# Altium footprint library Pcb-hionyPcbLib.PcbLib: 580 footprints (part 7 of 37)
Each footprint in its own frame and in the unit in brackets; x right, y up, seen from the top. Pads: shape width x height; smd on the part's side, far side on the other; paste and mask are expansions set on the pad; w line width, h text height; cw(c..) or ccw(c..) is an arc to the next point about the centre after c.
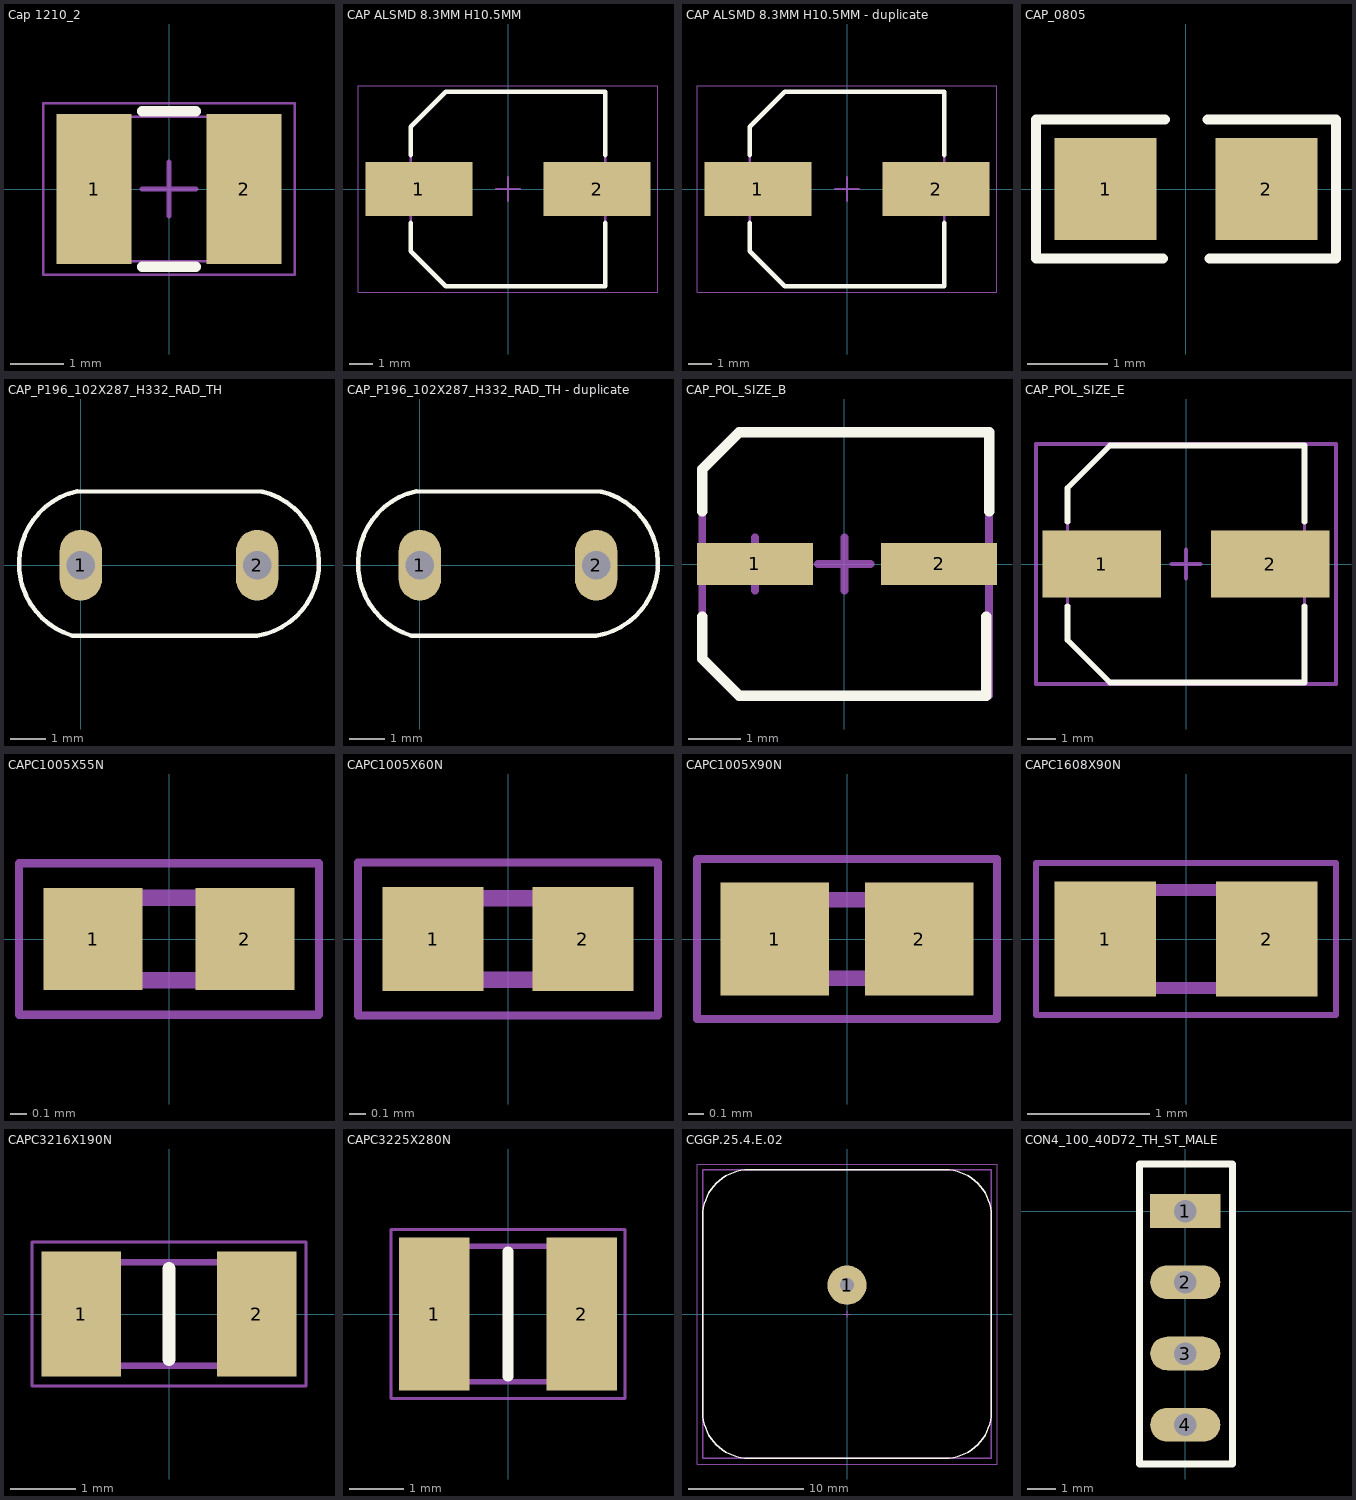
[diagram p6: the footprints below, top view; thin cyan lines are the x and y axes]

## Cap 1210_2 [mm]
pads (2):
  rect 1.4x2.8 smd: 1(-1.4,0) 2(1.4,0)
Top Overlay:
  lines w0.2: -0.5,-1.45 0.5,-1.45 ; -0.5,1.45 0.5,1.45
Mechanical 11:
  text ".Designator" at -0.675,-0.225 h0.5
Mechanical 13:
  lines w0.05: -1.7,-1.35 1.7,-1.35 1.7,1.35 -1.7,1.35 -1.7,-1.35
Mechanical 15:
  lines w0.05: -2.35,-1.6 2.35,-1.6 2.35,1.6 -2.35,1.6 -2.35,-1.6
  lines w0.1: -0.5,0 0.5,0 ; 0,-0.5 0,0.5
3D body: height 2.8, standoff 0, extent -1.2,-1.35 1.2,1.35
3D body: height 2.8, standoff 0, extent -1.7,-1.35 -1.2,1.35
3D body: height 2.8, standoff 0, extent 1.2,-1.35 1.7,1.35

## CAP ALSMD 8.3MM H10.5MM [mm]
pads (2):
  rect 4.55x2.3 smd: 1(-3.8,0) 2(3.8,0)
Top Overlay:
  lines w0.2: -4.15,-1.45 -4.15,-2.65 -2.65,-4.15 4.15,-4.15 4.15,-1.45 ; -4.15,1.45 -4.15,2.65 -2.65,4.15 4.15,4.15 4.15,1.45
Mechanical 13:
  lines w0.1: -4.15,-2.65 -2.65,-4.15 4.15,-4.15 4.15,4.15 -2.65,4.15 -4.15,2.65 -4.15,-2.65
Mechanical 15:
  lines w0.05: -6.4,-4.4 -6.4,4.4 6.4,4.4 6.4,-4.4 -6.4,-4.4
  lines w0.1: -0.5,0 0.5,0 ; 0,-0.5 0,0.5
3D body "CAP ALUM 8_3mm.STEP": height 10.5, standoff 0, extent -4.95,-4.15 4.95,4.15

## CAP ALSMD 8.3MM H10.5MM - duplicate [mm]
pads (2):
  rect 4.55x2.3 smd: 1(-3.8,0) 2(3.8,0)
Top Overlay:
  lines w0.2: -4.15,-1.45 -4.15,-2.65 -2.65,-4.15 4.15,-4.15 4.15,-1.45 ; -4.15,1.45 -4.15,2.65 -2.65,4.15 4.15,4.15 4.15,1.45
Mechanical 13:
  lines w0.1: -4.15,-2.65 -2.65,-4.15 4.15,-4.15 4.15,4.15 -2.65,4.15 -4.15,2.65 -4.15,-2.65
Mechanical 15:
  lines w0.05: -6.4,-4.4 -6.4,4.4 6.4,4.4 6.4,-4.4 -6.4,-4.4
  lines w0.1: -0.5,0 0.5,0 ; 0,-0.5 0,0.5
3D body "CAP ALUM 8_3mm.STEP": height 10.5, standoff 0, extent -4.95,-4.15 4.95,4.15

## CAP_0805 [mm] "Ceramic Capacitor"
height 0.7
pads (2):
  rect 1.27x1.27 smd mask+0.076: 1(-1,0) 2(1,0)
Top Overlay:
  lines w0.127: -0.289,-0.864 -1.864,-0.864 -1.864,0.864 -0.263,0.864 ; 0.27,0.864 1.845,0.864 ; 0.295,-0.864 1.845,-0.864 ; 1.864,-0.864 1.864,0.864
3D body "0805 SMD Capacitor.STEP": height 0.78, standoff 0, extent -1,-0.625 1,0.625

## CAP_P196_102X287_H332_RAD_TH [mm]
pads (2):
  oval 1.2x2 hole 0.8 mask+0.076: 1(0,0) 2(5,0)
Top Overlay:
  lines w0.127: -0.243,-1.993 cw(c0.368,0.034) -0.1,2.1 5.131,2.083 ; -0.2,-2 5,-2 ccw(c4.667,0.057) 5.156,2.083
3D body "User Library-CAPML200 (2_5x6_6).step": height 9.14, standoff -3.77, extent -1.037,-1.3 6.037,1.3

## CAP_P196_102X287_H332_RAD_TH - duplicate [mm]
pads (2):
  oval 1.2x2 hole 0.8 mask+0.076: 1(0,0) 2(5,0)
Top Overlay:
  lines w0.127: -0.243,-1.993 cw(c0.368,0.034) -0.1,2.1 5.131,2.083 ; -0.2,-2 5,-2 ccw(c4.667,0.057) 5.156,2.083
3D body "User Library-CAPML200 (2_5x6_6).step": height 9.14, standoff -3.77, extent -1.037,-1.3 6.037,1.3

## CAP_POL_SIZE_B [mm]
pads (2):
  rect 2.2x0.8 smd: 1(-1.7,0) 2(1.8,0)
Top Overlay:
  lines w0.2: -2.7,-1 -2.7,-1.8 -2,-2.5 2.7,-2.5 2.7,-1 ; -2.7,1 -2.7,1.8 -2,2.5 2.75,2.5 2.75,1
Mechanical 15:
  lines w0.15: -2.2,0 -1.2,0 ; -1.7,-0.5 -1.7,0.5 ; -0.5,0 0.5,0 ; 0,-0.5 0,0.5 ; -2.7,-1.8 -2.7,1.8 -2,2.5 2.75,2.5 2.75,-2.5 -2,-2.5 -2.7,-1.8
  text ".Designator" at -0.741,0.85 h0.55
3D body "猞4 SIZE CODE B.stp": height 5.8, standoff 0, extent -2.5,-2.15 2.5,2.15

## CAP_POL_SIZE_E [mm]
pads (2):
  rect 4.15x2.35 smd: 1(-2.95,0) 2(2.95,0)
Top Overlay:
  lines w0.2: -4.15,-1.475 -4.15,-2.663 -2.663,-4.15 4.15,-4.15 4.15,-1.475 ; -4.15,1.475 -4.15,2.663 -2.663,4.15 4.15,4.15 4.15,1.475
Mechanical 13:
  lines w0.1: -4.15,-2.663 -2.663,-4.15 4.15,-4.15 4.15,4.15 -2.663,4.15 -4.15,2.663 -4.15,-2.663
Mechanical 15:
  lines w0.1: -4.9,0 -3.4,0 ; -4.15,-0.75 -4.15,0.75
  lines w0.15: -0.5,0 0.5,0 ; 0,-0.5 0,0.5 ; -5.25,-4.2 -5.25,4.2 5.25,4.2 5.25,-4.2 -5.25,-4.2
  text ".Designator" at 1.825,-0.98 h0.55
3D body "User Library-capacitor size E.step": height 6.2, standoff -0.01, extent -4.5,-4.15 4.5,4.15

## CAPC1005X55N [mm]
pads (2):
  rect 0.6x0.62 smd: 1(-0.46,0) 2(0.46,0)
Mechanical 13:
  lines w0.1: -0.5,-0.25 0.5,-0.25 0.5,0.25 -0.5,0.25 -0.5,-0.25
Mechanical 15:
  lines w0.05: -0.91,-0.46 0.91,-0.46 0.91,0.46 -0.91,0.46 -0.91,-0.46
3D body "CL05B104KO5NNNC.stp": height 0.55, standoff 0, extent -0.5,-0.25 0.5,0.25

## CAPC1005X60N [mm]
pads (2):
  rect 0.62x0.64 smd: 1(-0.46,0) 2(0.46,0)
Mechanical 13:
  lines w0.1: -0.5,-0.25 0.5,-0.25 0.5,0.25 -0.5,0.25 -0.5,-0.25
Mechanical 15:
  lines w0.05: -0.92,-0.47 0.92,-0.47 0.92,0.47 -0.92,0.47 -0.92,-0.47
3D body "CL05A105KA5NQNC.stp": height 0.6, standoff 0, extent -0.5,-0.25 0.5,0.25

## CAPC1005X90N [mm]
pads (2):
  rect 0.69x0.72 smd: 1(-0.46,0) 2(0.46,0)
Mechanical 13:
  lines w0.1: -0.5,-0.25 -0.5,0.25 0.5,0.25 0.5,-0.25 -0.5,-0.25
Mechanical 15:
  lines w0.05: -0.955,-0.51 -0.955,0.51 0.955,0.51 0.955,-0.51 -0.955,-0.51
3D body "CL05A475MP5NRNC.stp": height 0.9, standoff 0, extent -0.5,-0.25 0.5,0.25

## CAPC1608X90N [mm]
pads (2):
  rect 0.83x0.94 smd: 1(-0.66,0) 2(0.66,0)
Mechanical 13:
  lines w0.1: -0.8,-0.4 0.8,-0.4 0.8,0.4 -0.8,0.4 -0.8,-0.4
Mechanical 15:
  lines w0.05: -1.225,-0.62 1.225,-0.62 1.225,0.62 -1.225,0.62 -1.225,-0.62
3D body "CC0603KRX7R9BB104.stp": height 0.9, standoff 0, extent -0.8,-0.4 0.8,0.4

## CAPC3216X190N [mm]
pads (2):
  rect 1.22x1.92 smd: 1(-1.35,0) 2(1.35,0)
Top Overlay:
  lines w0.2: 0,-0.7 0,0.7
Mechanical 13:
  lines w0.1: -1.6,-0.8 -1.6,0.8 1.6,0.8 1.6,-0.8 -1.6,-0.8
Mechanical 15:
  lines w0.05: -2.11,-1.11 -2.11,1.11 2.11,1.11 2.11,-1.11 -2.11,-1.11
3D body "1206B475K500NT.stp": height 1.9, standoff 0, extent -1.6,-0.8 1.6,0.8

## CAPC3225X280N [mm]
pads (2):
  rect 1.3x2.82 smd: 1(-1.36,0) 2(1.36,0)
Top Overlay:
  lines w0.2: 0,-1.15 0,1.15
Mechanical 13:
  lines w0.1: -1.6,-1.25 -1.6,1.25 1.6,1.25 1.6,-1.25 -1.6,-1.25
Mechanical 15:
  lines w0.05: -2.16,-1.56 -2.16,1.56 2.16,1.56 2.16,-1.56 -2.16,-1.56
3D body "CL32A107MPVNNNE.stp": height 2.8, standoff 0, extent -1.6,-1.25 1.6,1.25

## CGGP.25.4.E.02 [mm]
pads (1):
  round 3.4 hole 1.2: 1(0,2.5)
Top Overlay:
  lines w0.127: -12.5,-8.5 ccw(c-8.5,-8.5) -8.5,-12.5 8.5,-12.5 ccw(c8.5,-8.5) 12.5,-8.5 12.5,8.5 ccw(c8.5,8.5) 8.5,12.5 -8.5,12.5 ccw(c-8.5,8.5) -12.5,8.5 -12.5,-8.5
Mechanical 11:
  text ".Designator" at -0.573,4.994 h0.5
Mechanical 13:
  lines w0.127: -12.5,-12.5 12.5,-12.5 12.5,12.5 -12.5,12.5 -12.5,-12.5
Mechanical 15:
  lines w0.05: -0.3,0 0.3,0 ; 0,-0.3 0,0.3
  lines w0.064: -13,-13 13,-13 13,13 -13,13 -13,-13
3D body "CGGP.25.4.E.02.step": height 4.73, standoff -1.47, extent -12.55,-12.55 12.55,12.55

## CON4_100_40D72_TH_ST_MALE [mm] "Berg Strip"
height 11.5
pads (4):
  rect 2.5x1.2 hole 0.8: 1(0,0)
  oval 2.5x1.2 hole 0.8: 2(0,-2.54) 3(0,-5.08) 4(0,-7.62)
Top Overlay:
  lines w0.254: -1.626,-9.017 -1.626,1.676 1.676,1.676 1.676,0.914 1.676,-9.017 -1.626,-9.017
3D body "65781.stp": height 8.55, standoff -2.99, extent -1.143,-8.763 1.397,1.397